# Altium footprint library Connectors USB.PcbLib: 22 footprints (part 2 of 2)
Each footprint in its own frame and in the unit in brackets; x right, y up, seen from the top. Pads: shape width x height; smd on the part's side, far side on the other; paste and mask are expansions set on the pad; w line width, h text height; cw(c..) or ccw(c..) is an arc to the next point about the centre after c.
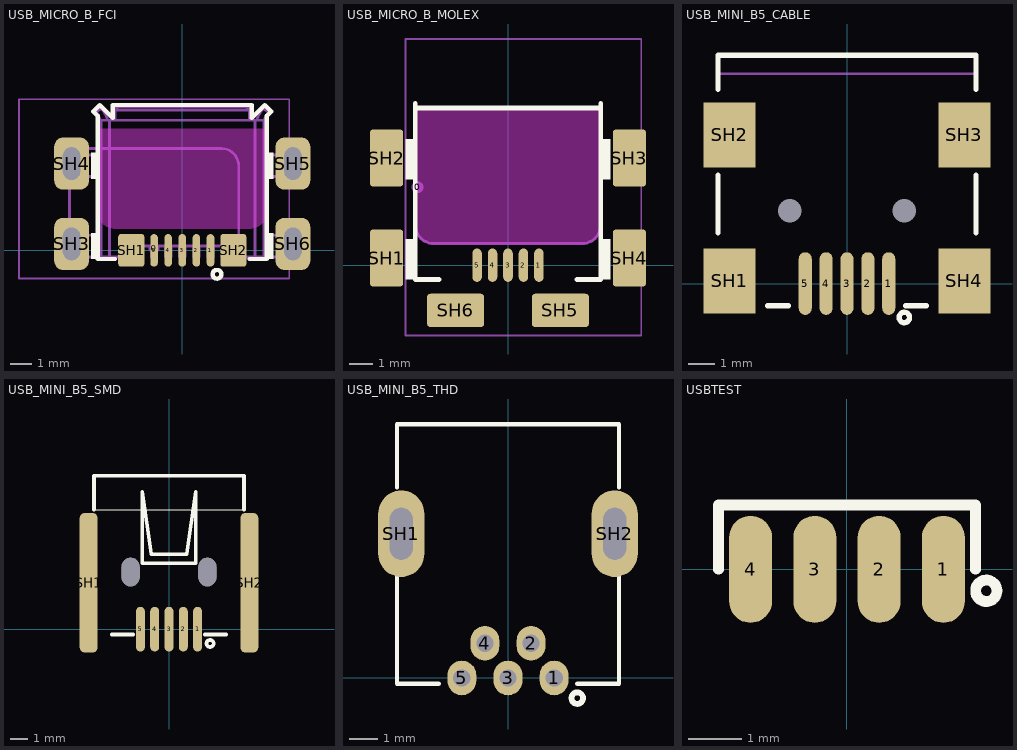
[diagram p1: the footprints below, top view; thin cyan lines are the x and y axes]

## USB_MICRO_B_FCI [mm] "CONN, USB Micro AB"
height 2.286
pads (12):
  round 0.508 on Mech15: 0(-1.3,0.1)
  oval 0.35x1.5 smd: 1(1.3,0) 2(0.65,0) 3(0,0) 4(-0.65,0) 5(-1.3,0)
  rrect20% 1.2x1.5 smd: SH1(-2.35,0) SH2(2.35,0)
  rrect50% 1.6x2.4 hole 0.8 slot 1.5 at 90 deg: SH3(-5.1,0.3) SH4(-5.1,4) SH5(5.1,4) SH6(5.1,0.3)
Top Overlay:
  circle w0.2: c1.6,-1.1 r0.2
  rectangle: -4.2,-0.4 -3.8,0.8
  region: 4.2,0.8 3.8,0.8 3.8,-0.4 4.2,-0.4
  region: 4.2,4.5 3.8,4.5 3.8,3.3 4.2,3.3
  rectangle: -4.2,3.3 -3.8,4.5
  lines w0.2: -3.9,-0.4 -3.1,-0.4 ; -3.9,0.8 -3.9,3.3 ; -3.9,4.5 -3.9,6.2 -4.1,6.4 -3.8,6.7 -3.2,6.1 -3.2,6.7 3.2,6.7 3.2,6.1 3.8,6.7 4.1,6.4 3.9,6.2 3.9,4.5 ; 3.1,-0.4 3.9,-0.4 ; 3.9,0.8 3.9,3.3
Keep-Out Layer:
  board cut-out: 3.9,5.6 3.9,1.803 3.9,1.725 3.869,1.57 3.809,1.425 3.721,1.293 3.61,1.182 3.479,1.094 3.333,1.034 3.179,1.003 3.1,1.003 -3.1,1.003 -3.179,1.003 -3.333,1.034 -3.479,1.094 -3.61,1.182 -3.721,1.293 -3.809,1.425 -3.869,1.57 -3.9,1.725 -3.9,1.803 -3.9,5.6
Mechanical 13:
  lines w0.127: -4.85,-0.3 -4.85,0.7 ; -4.85,3.4 -4.85,4.4 ; -3.97,6.381 -3.71,6.531 ; -3.85,-0.3 -3.85,0.7 ; -3.85,3.4 -3.85,4.4 ; -3.75,-0.3 -3.75,6 ; -3.75,0.7 -5.25,0.7 -5.25,-0.3 -2.577,-0.3 ccw(c-2.577,-0.1) -2.443,-0.248 -2.007,0.148 cw(c-1.873,0) -1.873,0.2 1.873,0.2 cw(c1.873,0) 2.007,0.148 2.443,-0.248 ccw(c2.577,-0.1) 2.577,-0.3 5.25,-0.3 5.25,0.7 3.75,0.7 ; -3.75,3.4 -5.25,3.4 -5.25,4.4 -3.75,4.4 ; -3.45,6 ccw(c-3.75,6.001) -3.49,6.151 -3.76,6.618 -4.02,6.468 -3.75,6 ; -3.35,-0.3 -3.35,6 ; -3.1,6.381 cw(c-3.006,6.374) -3,6.468 ; -2.526,-0.3 -2.526,-0.293 ; -2.229,-0.053 cw(c-2.275,-0.3) -2.024,-0.3 -1.825,-0.3 -1.825,0.2 ; -1.425,0.2 -1.425,-0.3 -1.175,-0.3 -1.175,0.2 ; -0.775,0.2 -0.775,-0.3 -0.525,-0.3 -0.525,0.2 ; -0.125,0.2 -0.125,-0.3 0.125,-0.3 0.125,0.2 ; 0.525,0.2 0.525,-0.3 0.775,-0.3 0.775,0.2 ; 1.175,0.2 1.175,-0.3 1.425,-0.3 1.425,0.2 ; 1.825,0.2 1.825,-0.3 2.024,-0.3 cw(c2.275,-0.3) 2.229,-0.053 ; 2.526,-0.3 2.526,-0.293 ; 3.1,6.381 ccw(c3.006,6.374) 3,6.468 ; 3.35,-0.3 3.35,6 ; 3.45,6 cw(c3.75,6.001) 3.49,6.151 3.76,6.618 4.02,6.468 3.75,6 ; 3.71,6.531 3.97,6.381 ; 3.75,-0.3 3.75,6 ; 3.75,3.4 5.25,3.4 5.25,4.4 3.75,4.4 ; 3.85,-0.3 3.85,0.7 ; 3.85,3.4 3.85,4.4 ; 4.85,-0.3 4.85,0.7 ; 4.85,3.4 4.85,4.4 ; -3.75,6 -3.1,6 ; -3.1,6 -3.1,6.531 cw(c-3.006,6.524) -3,6.618 ; -3.1,6.001 3.1,6 ; -3,6.468 -3,6.618 ; -3,6.468 3,6.468 ; -3,6.618 3,6.618 ; 3,6.468 3,6.618 ; 3,6.618 cw(c3.006,6.524) 3.1,6.531 3.1,6 ; 3.1,6 3.75,6
Mechanical 15:
  lines w0.076: -7.523,-1.297 -7.523,6.958 4.923,6.958 4.923,-1.297 -7.523,-1.297
  lines w0.127: -5.2,0.1 -5.2,3.897 cw(c-4.4,3.897) -4.4,4.697 1.8,4.697 cw(c1.8,3.897) 2.6,3.897 2.6,0.1
3D body "Micro USB B-type mid-mount FCI.STEP": height 2.15, standoff -0.92, extent -5.25,-0.3 5.25,6.618
3D body "USB Micro B plug.STEP": height 4.67, standoff -3.53, extent -5.35,2.579 5.35,27.079

## USB_MICRO_B_MOLEX [mm] "CONN, USB Micro AB"
height 1.2
pads (12):
  round 0.508 on Mech15: 0(-3.8,3.275)
  oval 0.4x1.4 smd mask+0.05: 1(1.3,0) 2(0.65,0) 3(0,0) 4(-0.65,0) 5(-1.3,0)
  rrect20% 1.4x2.4 smd: SH1(-5.1,0.3) SH2(-5.1,4.5) SH3(5.1,4.5) SH4(5.1,0.3)
  rrect20% 2.4x1.4 smd: SH5(2.2,-1.9) SH6(-2.2,-1.9)
Top Overlay:
  rectangle: -4.3,-0.6 -3.8,1.1
  region: 4.3,1.1 3.8,1.1 3.8,-0.6 4.3,-0.6
  region: 4.3,5.3 3.8,5.3 3.8,3.6 4.3,3.6
  rectangle: -4.3,3.6 -3.8,5.3
  lines w0.2: -3.9,-0.6 -2.9,-0.6 ; -3.9,1.1 -3.9,6.8 ; -3.898,6.602 3.9,6.602 ; 2.9,-0.6 3.9,-0.6 ; 3.9,1.1 3.9,6.8
Keep-Out Layer:
  board cut-out: 3.9,6.602 3.9,1.675 3.9,1.596 3.869,1.442 3.809,1.296 3.721,1.165 3.61,1.054 3.479,0.966 3.333,0.906 3.179,0.875 3.1,0.875 -3.1,0.875 -3.179,0.875 -3.333,0.906 -3.479,0.966 -3.61,1.054 -3.721,1.165 -3.809,1.296 -3.869,1.442 -3.9,1.596 -3.9,1.675 -3.9,6.602
Mechanical 13:
  lines w0.127: -3.9,6.5 -3.9,1.7 ccw(c-3.1,1.7) -3.1,0.9 3.1,0.9 ccw(c3.1,1.7) 3.9,1.7 3.9,6.5
Mechanical 15:
  lines w0.076: -4.3,-2.948 5.598,-2.948 5.598,9.498 -4.3,9.498 -4.3,-2.948
3D body "Micro USB B Receptacle Middle Mount.STEP": height 1.43, standoff -1.52, extent -5.5,-2.2 5.5,6.93
3D body "USB Micro B plug.STEP": height 4.1, standoff -4.1, extent -5.35,3.008 5.35,27.508

## USB_MINI_B5_CABLE [mm] "CONN, USB MINI B, 5PIN, RIGHT ANGLE, SMD"
pads (11):
  oval 0.5x2.4 smd mask+0.05: 1(1.6,0) 2(0.8,0) 3(0,0) 4(-0.8,0) 5(-1.6,0)
  rect 2x2.5 smd: SH1(-4.5,0.1) SH2(-4.5,5.7) SH3(4.5,5.7) SH4(4.5,0.1)
  round 0.6 hole 0.9 unplated: ""(-2.2,2.8) ""(2.2,2.8)
Top Overlay:
  circle w0.2: c2.2,-1.3 r0.2
  lines w0.2: -4.95,1.95 -4.95,4.15 ; -4.95,7.45 -4.95,8.75 4.95,8.75 4.95,7.45 ; -3.05,-0.85 -2.25,-0.85 ; 2.25,-0.85 3.05,-0.85 ; 4.95,1.95 4.95,4.15
Mechanical 1:
  lines w0.1: -4.95,8.05 4.95,8.05
  text "PCB Edge" at 4.036,8.482 h0.25
3D body "Samtec-DEFAULT.STEP": height 5.8, standoff -1.8, extent -5.156,1.618 5.644,48.218
3D body "usb_a-usb_b-m5-smd-c.STEP": height 3.98, standoff -0.95, extent -4.8,-0.725 5.1,8.525

## USB_MINI_B5_SMD [mm] "CONN, USB MINI B, 5PIN, RIGHT ANGLE, SMD"
pads (9):
  oval 0.5x2.5 smd mask+0.075: 1(1.6,0) 2(0.8,0) 3(0,0) 4(-0.8,0) 5(-1.6,0)
  rrect50% 1x7.8 smd: SH1(-4.5,2.6) SH2(4.5,2.6)
  oval 1x1.6 hole 1 slot 1.6 at 90 deg unplated: ""(-2.15,3.2) ""(2.15,3.2)
Top Overlay:
  circle w0.2: c2.3,-0.8 r0.2
  lines w0.05: -4.2,6.7 4.2,6.7
  lines w0.2: -4.2,6.7 -4.2,8.6 4.2,8.6 4.2,6.7 ; -3.2,-0.3 -2,-0.3 ; 2,-0.3 3.2,-0.3 ; -1.5,3.7 -1.5,7.7 -1,4.2 1,4.2 1.5,7.7 1.5,3.7 -1.5,3.7
3D body "USB_mini_B.step": height 3.95, standoff -1, extent -5.35,-0.2 5.35,9

## USB_MINI_B5_THD [mm] "CONN, USB MINI B, 5PIN, RIGHT ANGLE, THD"
pads (7):
  oval 1x1.2 hole 0.6 mask+0.075: 1(1.6,0) 2(0.8,1.2) 3(0,0) 4(-0.8,1.2) 5(-1.6,0)
  oval 1.6x3 hole 0.8 slot 1.8 at 90 deg: SH1(-3.7,5) SH2(3.7,5)
Top Overlay:
  circle w0.2: c2.4,-0.7 r0.2
  lines w0.15: -3.85,3.5 -3.85,-0.2 -2.4,-0.2 ; -3.85,6.6 -3.85,8.8 3.85,8.8 3.85,6.6 ; 2.4,-0.2 3.85,-0.2 3.85,3.5
3D body "Samtec-DEFAULT.STEP": height 5.8, standoff -1.8, extent -5.212,2.24 5.588,48.84
3D body "5877.STEP": height 3.95, standoff -1.8, extent -3.85,-0.2 3.85,8.8

## USBTEST [mm] "CONN, USB A Receptacle RIGHT ANGLE"
height 7
pads (4):
  oval 0.8x2 smd mask+0.1: 1(1.8,0) 2(0.6,0) 3(-0.6,0) 4(-1.8,0)
Top Overlay:
  circle w0.2: c2.6,-0.4 r0.2
  lines w0.2: -2.4,0 -2.4,1.2 2.4,1.2 2.4,0